# Altium footprint library VESC_MotorController.PcbLib: 146 footprints (part 9 of 10)
Each footprint in its own frame and in the unit in brackets; x right, y up, seen from the top. Pads: shape width x height; smd on the part's side, far side on the other; paste and mask are expansions set on the pad; w line width, h text height; cw(c..) or ccw(c..) is an arc to the next point about the centre after c.
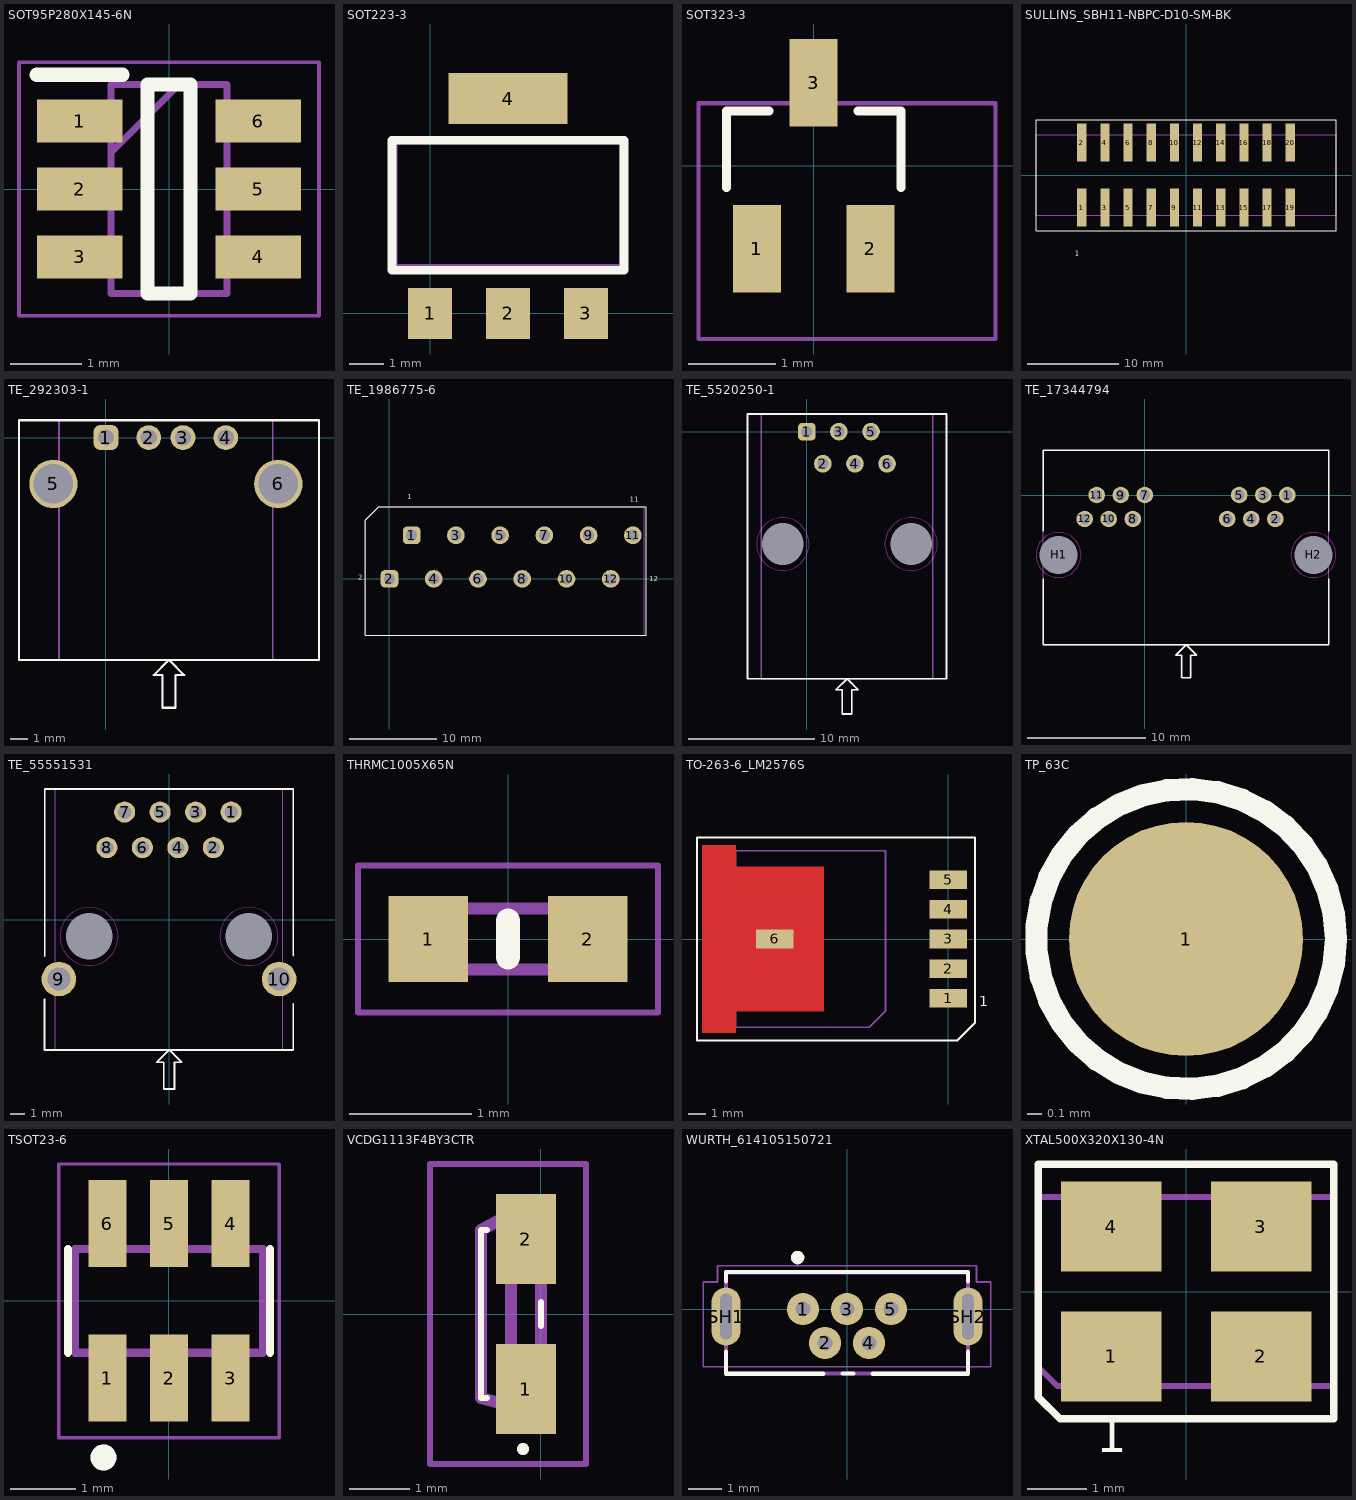
[diagram p8: the footprints below, top view; thin cyan lines are the x and y axes]

## SOT95P280X145-6N [mm]
pads (6):
  rect 1.2x0.6 smd: 1(-1.25,0.95) 2(-1.25,0) 3(-1.25,-0.95) 4(1.25,-0.95) 5(1.25,0) 6(1.25,0.95)
Top Overlay:
  lines w0.2: -1.85,1.6 -0.65,1.6 ; -0.3,-1.462 -0.3,1.462 0.3,1.462 0.3,-1.462 -0.3,-1.462
Mechanical 15:
  lines w0.1: -0.812,0.512 0.138,1.462 ; -0.812,-1.462 -0.812,1.462 0.812,1.462 0.812,-1.462 -0.812,-1.462
Mechanical 20:
  lines w0.05: -2.1,-1.775 -2.1,1.775 2.1,1.775 2.1,-1.775 -2.1,-1.775
3D body "USBLC6-2SC6Y.stp": height 1.45, standoff 0, extent -1.4,-1.462 1.4,1.462

## SOT223-3 [mm]
height 2
pads (4):
  rect 1.3x1.5 smd: 1(0,0) 2(2.286,0) 3(4.572,0)
  rect 3.5x1.5 smd: 4(2.286,6.299)
Top Overlay:
  lines w0.254: -1.116,1.27 5.688,1.27 5.688,5.08 -1.116,5.08 -1.116,1.27
Mechanical 1:
  lines w0.2: -1.05,1.35 5.65,1.35 5.65,5.05 -1.05,5.05 -1.05,1.35
3D body "SW3dPS-sot-223.step": height 1.64, standoff -0.04, extent -1,-0.3 5.5,6.632

## SOT323-3 [mm]
pads (3):
  rect 0.55x1 smd: 1(-0.65,-0.95) 2(0.65,-0.95) 3(0,0.95)
Top Overlay:
  lines w0.1: -1,-0.254 -1,0.625 -0.508,0.625 ; 0.508,0.625 1,0.625 1,-0.254
Mechanical 20:
  lines w0.05: -1.319,-1.985 -1.319,0.715 2.081,0.715 2.081,-1.985 -1.319,-1.985
3D body "BSS138PW,115.stp": height 0.93, standoff -0.02, extent -1.084,-1.05 1.016,1.05

## SULLINS_SBH11-NBPC-D10-SM-BK [mil] "SBH11-NBPC-D10-SM-BK,CONN HEADER SMD 20POS 2.54MM"
height 418.11
pads (20):
  rect 40x164 smd mask+2: 1(-450,-140.75) 2(-450,140.75) 3(-350,-140.75) 4(-350,140.75) 5(-250,-140.75) 6(-250,140.75) 7(-150,-140.75) 8(-150,140.75) 9(-50,-140.75) 10(-50,140.75) 11(50,-140.75) 12(50,140.75) 13(150,-140.75) 14(150,140.75) 15(250,-140.75) 16(250,140.75) 17(350,-140.75) 18(350,140.75) 19(450,-140.75) 20(450,140.75)
Top Overlay:
  lines w5: -647.64,-240 647.64,-240 647.64,240 -647.64,240 -647.64,-240
  text "1" at -480,-360 h40
Mechanical 13:
  lines w4: -647.64,-173.23 647.64,-173.23 647.64,173.23 -647.64,173.23 -647.64,-173.23
  text "2" at -458.43,119.35 h40
  text "20" at 428.99,113.28 h40
  text "19" at 435.07,-148.32 h40
  text "1" at -458.01,-156.28 h40
  text ".Designator" at -82.6,-12.07 h40
3D body "SBH11-_ _ _C-D10-SM-_ _.STEP": height 419.29, standoff 1.18, extent -647.45,-202.76 647.64,202.76

## TE_292303-1 [mil] "292303-1,USB-A (USB TYPE-A) USB 2.0 Receptacle Connector 4 Position Through Hole, Right Angle"
height 275.59
pads (6):
  rrect50% 57x57 hole 37 mask+2: 1(0,0)
  round 57 hole 37 mask+2: 2(98.43,0) 3(177.17,0) 4(275.59,0)
  round 111 hole 91 mask+2: 5(-120.87,-106.69) 6(396.46,-106.69)
Top Overlay:
  lines w5: 129.93,-546.42 110,-546.42 145,-511.42 180,-546.42 160,-546.42 160,-621.42 130,-621.42 130,-546.42 ; -200,-511.42 490,-511.42 490,39.76 -200,39.76 -200,-511.42
Mechanical 13:
  lines w4: 129.19,-546.42 109.26,-546.42 144.26,-511.42 179.26,-546.42 159.26,-546.42 159.26,-621.42 ; 129.26,-621.42 129.26,-546.42 ; -108.27,-511.42 383.86,-511.42 383.86,39.76 -108.27,39.76 -108.27,-511.42
  text ".Designator" at 138.63,-220.61 h40
3D body "292303-1.stp": height 300.2, standoff -147.3, extent -181.77,-511.42 457.36,39.76

## TE_1986775-6 [mil]
height 590.55
pads (12):
  rrect50% 80x80 hole 50 mask+2: 1(100,196.85) 2(0,0)
  round 80 hole 50 mask+2: 3(300,196.85) 4(200,0) 5(500,196.85) 6(400,0) 7(700,196.85) 8(600,0) 9(900,196.85) 10(800,0) 11(1100,196.85) 12(1000,0)
Top Overlay:
  lines w5: -110,-255.91 1160,-255.91 1160,326.77 -48.23,326.77 -110,265 -110,-255.91
  text "1" at 80,350 h40
  text "2" at -142.27,-13.73 h40
  text "12" at 1173.54,-19.09 h40
  text "11" at 1086.02,339.77 h40
Mechanical 13:
  lines w4: -106.51,-255.91 1151.97,-255.91 1151.97,326.77 -48.23,326.77 -106.51,268.49 -106.51,-255.91
  text "12" at 965,-105 h40
  text "11" at 1065,100 h40
  text "2" at -20,-100 h40
  text "1" at 30,175 h40
  text ".Designator" at 475.36,74.06 h40
3D body "1986775-6.stp": height 574.8, standoff -131.89, extent -107.08,-255.91 1151.97,326.77

## TE_5520250-1 [mil] "5520250-1,CONN MOD JACK 6P2C R/A UNSHLD"
height 635.04
pads (8):
  rrect50% 55x55 hole 35 mask+2: 1(0,0)
  round 55 hole 35 mask+2: 2(50,-100) 3(100,0) 4(150,-100) 5(200,0) 6(250,-100)
  round 0 hole 130 unplated mask+2: ""(-74.8,-350) ""(325.2,-350)
Top Overlay:
  lines w5: 110.49,-804.71 90.57,-804.71 125.57,-769.71 160.57,-804.71 140.57,-804.71 140.57,-879.71 110.57,-879.71 110.57,-804.71 ; -184.8,-770.08 435.2,-770.08 435.2,55.12 -184.8,55.12 -184.8,-770.08
Keep-Out Layer:
  circle w2: c-74.8,-350 r81.84
  circle w2: c325.2,-350 r81.84
Mechanical 13:
  lines w4: 109.75,-804.71 89.83,-804.71 124.83,-769.71 159.83,-804.71 139.83,-804.71 139.83,-879.71 ; 109.83,-879.71 109.83,-804.71 ; -142.52,-770.08 392.91,-770.08 392.91,55.12 -142.52,55.12 -142.52,-770.08
  text ".Designator" at 123.03,-359.04 h40
3D body "5520250-1.stp": height 629.65, standoff -150.35, extent -184.8,-764.88 435.2,55.12

## TE_17344794 [mm]
pads (14):
  round 1.4 hole 0.9: 1(12.07,0) 2(11.05,-2.03) 3(10.03,0) 4(9.01,-2.03) 5(7.99,0) 6(6.97,-2.03) 7(0,0) 8(-1.02,-2.03) 9(-2.04,0) 10(-3.06,-2.03) 11(-4.08,0) 12(-5.1,-2.03)
  round 1.6 hole 3.2 unplated: H1(-7.31,-5.08) H2(14.28,-5.08)
Top Overlay:
  lines w0.127: -8.585,-7.11 -8.585,-12.7 15.555,-12.7 15.555,-7.11 ; -8.585,-3.05 -8.585,3.81 15.555,3.81 15.555,-3.05 ; 3.107,-13.589 2.601,-13.589 3.49,-12.7 4.379,-13.589 3.871,-13.589 3.871,-15.494 3.109,-15.494 3.109,-13.589
Keep-Out Layer:
  circle w0.051: c14.28,-5.08 r1.906
  circle w0.051: c-7.31,-5.08 r1.906
Mechanical 13:
  lines w0.102: 3.088,-13.589 2.582,-13.589 3.471,-12.7 4.36,-13.589 3.852,-13.589 3.852,-15.494 ; 3.09,-15.494 3.09,-13.589 ; -8.585,-12.7 -8.585,3.81 15.555,3.81 15.555,-12.7 -8.585,-12.7
  text ".Designator" at 2.418,-4.055 h1.02
3D body "1734479-4.stp": height 12.93, standoff -3.13, extent -8.58,-12.7 15.56,3.81

## TE_55551531 [mm]
pads (12):
  round 1.509 hole 0.97: 1(4.445,7.685) 2(3.175,5.145) 3(1.905,7.685) 4(0.635,5.145) 5(-0.635,7.685) 6(-1.905,5.145) 7(-3.175,7.685) 8(-4.445,5.145)
  round 2.475 hole 1.65: 9(-7.875,-4.255) 10(7.875,-4.255)
  round 0 hole 3.33 unplated: 11(-5.715,-1.205) 12(5.715,-1.205)
Top Overlay:
  lines w0.127: -8.902,-5.715 -8.902,-9.335 8.89,-9.335 8.89,-6.045 ; -8.89,-2.616 -8.89,9.335 8.89,9.335 8.89,-2.565 ; -0.373,-10.215 -0.88,-10.215 0.009,-9.326 0.898,-10.215 0.39,-10.215 0.39,-12.12 -0.372,-12.12 -0.372,-10.215
Keep-Out Layer:
  circle w0.051: c5.715,-1.205 r2.079
  circle w0.051: c-5.715,-1.205 r2.079
Mechanical 13:
  lines w0.051: -0.392,-10.215 -0.898,-10.215 -0.009,-9.326 0.88,-10.215 0.372,-10.215 0.372,-12.12 ; -0.39,-12.12 -0.39,-10.215 ; -8.13,-9.335 -8.13,9.335 8.13,9.335 8.13,-9.335 -8.13,-9.335
  text ".Designator" at -0.082,0.147 h1.02
3D body "5555153-1.stp": height 13.36, standoff -3.97, extent -8.89,-9.33 8.89,9.339

## THRMC1005X65N [mm]
pads (2):
  rect 0.65x0.7 smd: 1(-0.65,0) 2(0.65,0)
Top Overlay:
  lines w0.2: 0,-0.15 0,0.15
Mechanical 15:
  lines w0.1: -0.5,-0.25 -0.5,0.25 0.5,0.25 0.5,-0.25 -0.5,-0.25
Mechanical 20:
  lines w0.05: -1.225,-0.6 -1.225,0.6 1.225,0.6 1.225,-0.6 -1.225,-0.6
3D body "NTCS0402E3103GL1T.stp": height 0.65, standoff 0, extent -0.5,-0.25 0.5,0.25

## TO-263-6_LM2576S [mil] "LM2576S-ADJ/NOPB,IC REG BUCK ADJ 3A TO263-5"
height 181.1
pads (6):
  rect 85x42 smd mask+2: 1(0,-133.86) 2(0,-66.93) 3(0,0) 4(0,66.93) 5(0,133.86)
  rect 85x42 smd paste-196.85 mask+2: 6(-393.7,0)
Top Layer:
  region: -482.68,-163.98 -282.68,-163.98 -282.68,163.98 -482.68,163.98 -482.68,212.6 -557.87,212.6 -557.87,-212.6 -482.68,-212.6
Top Overlay:
  lines w5: -570,-230 -570,230 60,230 60,-190 20,-230 -570,-230
  text "1" at 70,-160 h40
Top Paste:
  region: -495.56,-157.01 -545.56,-157.01 -545.56,-207.01 -495.56,-207.01
  rectangle: -545.01,157.01 -495.01,207.01
  rectangle: -540.01,89.01 -490.01,139.01
  region: -425.01,139.01 -475.01,139.01 -475.01,89.01 -425.01,89.01
  region: -360.01,139.01 -410.01,139.01 -410.01,89.01 -360.01,89.01
  region: -295.01,139.01 -345.01,139.01 -345.01,89.01 -295.01,89.01
  rectangle: -541.01,19.01 -491.01,69.01
  region: -426.01,69.01 -476.01,69.01 -476.01,19.01 -426.01,19.01
  region: -361.01,69.01 -411.01,69.01 -411.01,19.01 -361.01,19.01
  region: -296.01,69.01 -346.01,69.01 -346.01,19.01 -296.01,19.01
  rectangle: -541.01,-55.99 -491.01,-5.99
  region: -426.01,-5.99 -476.01,-5.99 -476.01,-55.99 -426.01,-55.99
  region: -361.01,-5.99 -411.01,-5.99 -411.01,-55.99 -361.01,-55.99
  region: -296.01,-5.99 -346.01,-5.99 -346.01,-55.99 -296.01,-55.99
  region: -296.01,-80.99 -346.01,-80.99 -346.01,-130.99 -296.01,-130.99
  region: -361.01,-80.99 -411.01,-80.99 -411.01,-130.99 -361.01,-130.99
  region: -426.01,-80.99 -476.01,-80.99 -476.01,-130.99 -426.01,-130.99
  rectangle: -541.01,-130.99 -491.01,-80.99
Mechanical 13:
  lines w4: -482.68,-200 -482.68,200 -142.52,200 -142.52,-162.52 -180,-200 -482.68,-200
  text ".Designator" at -336.99,-0.62 h40
  text "1" at -8.27,-145.34 h40
  text "5" at -10.21,117.87 h40
3D body "NOPB.STEP": height 190.87, standoff 1.87, extent -531.55,-200 33.45,200

## TP_63C [mil]
height 590.55
pads (1):
  round 63 smd paste-78.74 mask+2: 1(0,0)
Top Overlay:
  circle w6: c0,0 r40.31
Mechanical 13:
  circle w4: c0,0 r40.31
  text ".Designator" at -6.96,30.62 h40

## TSOT23-6 [mm] "SOT23 semtech SM712"
height 1
pads (6):
  rect 0.59x1.34 smd: 1(-0.95,-1.19) 2(0,-1.19) 3(0.95,-1.19) 4(0.95,1.19) 5(0,1.19) 6(-0.95,1.19)
Top Overlay:
  circle w0.2: c-1.011,-2.416 r0.1
  lines w0.127: -1.558,-0.8 -1.558,0.8 ; 1.559,-0.8 1.559,0.8
Mechanical 13:
  circle w0.2: c-1.011,-2.416 r0.1
  lines w0.127: -1.45,-0.8 1.45,-0.8 1.45,0.8 -1.45,0.8 -1.45,-0.8
Mechanical 15:
  lines w0.05: -1.7,-2.11 1.7,-2.11 1.7,2.11 -1.7,2.11 -1.7,-2.11
3D body "step_temp.STEP": height 1, standoff 0, extent -1.45,-1.4 1.45,1.4

## VCDG1113F4BY3CTR [mm]
pads (2):
  rect 1x1.5 smd: 1(-0.25,-1.25) 2(-0.25,1.25)
Top Overlay:
  lines w0.1: -0.9,-1.4 -1,-1.4 -1,1.4 -0.9,1.4 ; 0,-0.2 0,0.2 ; -0.3,-2.3 cw(c-0.3,-2.25) -0.3,-2.2 cw(c-0.3,-2.25) -0.3,-2.3
Mechanical 15:
  lines w0.2: -0.25,-1.6 -1,-1.4 -1,1.4 -0.25,1.8 ; -0.5,-1.05 0,-1.05 0,1.05 -0.5,1.05 -0.5,-1.05 ; -0.5,-0.85 -0.5,0.85 -0.5,-0.85
Mechanical 20:
  lines w0.1: -1.85,-2.5 0.75,-2.5 0.75,2.5 -1.85,2.5 -1.85,-2.5
3D body "VCDG1113F-4BY3C-TR.stp": height 0.95, standoff -0.05, extent -0.6,-1.05 0,1.05

## WURTH_614105150721 [mm]
pads (7):
  round 0.948 hole 0.44: 1(-1.3,0) 2(-0.65,-1) 3(0,0) 4(0.65,-1) 5(1.3,0)
  oval 0.858x1.716 hole 0.35 slot 1.35 at 90 deg: SH1(-3.575,-0.22) SH2(3.575,-0.22)
Top Overlay:
  circle w0.2: c-1.46,1.524 r0.1
  lines w0.127: -3.575,-1.26 -3.575,-1.911 -0.699,-1.911 ; -3.575,0.82 -3.575,1.095 3.575,1.095 3.575,0.82 ; -0.127,-1.905 0.193,-1.905 ; 0.762,-1.912 3.575,-1.912 3.575,-1.26
Mechanical 13:
  circle w0.2: c-1.3,0 r0.1
  lines w0.127: -3.575,-1.905 3.575,-1.905 3.575,1.079 -3.575,1.079 -3.575,-1.905
Mechanical 15:
  lines w0.05: -4.25,-1.7 -4.25,0.8 -3.825,0.8 -3.825,1.28 3.825,1.28 3.825,0.8 4.25,0.8 4.25,-1.7 -4.25,-1.7
3D body "614105150621.stp": height 5.56, standoff -1.55, extent -4,-1.904 4,1.078

## XTAL500X320X130-4N [mil] "ASFL1-12.288MHZ-L-T,XTAL OSC XO 12.2880MHZ HCMOS TTL"
height 51.18
pads (4):
  rect 67x60 smd mask+2: 1(-50,-43.31) 2(50,-43.31) 3(50,43.31) 4(-50,43.31)
Top Overlay:
  lines w5: -98.43,-70.4 -83.83,-85 98.43,-85 98.43,85 -98.43,85 -98.43,-70.4
  text "1" at -60,-115 h40
Mechanical 13:
  lines w4: -98.43,-50.32 -98.43,62.99 98.43,62.99 98.43,-62.99 -85.76,-62.99 -98.43,-50.32
  text ".Designator" at -20.42,-4.32 h40
  text "1" at -55.74,-50.4 h40
  text "2" at 43.22,-46.1 h40
  text "3" at 44.75,33.54 h40
  text "4" at -62.31,32.97 h40
3D body "ASFL1.STEP": height 54.13, standoff 2.95, extent -98.42,-62.99 98.43,63